# Altium footprint library Item_pcb.PcbLib: 282 footprints (part 2 of 18)
Each footprint in its own frame and in the unit in brackets; x right, y up, seen from the top. Pads: shape width x height; smd on the part's side, far side on the other; paste and mask are expansions set on the pad; w line width, h text height; cw(c..) or ccw(c..) is an arc to the next point about the centre after c.
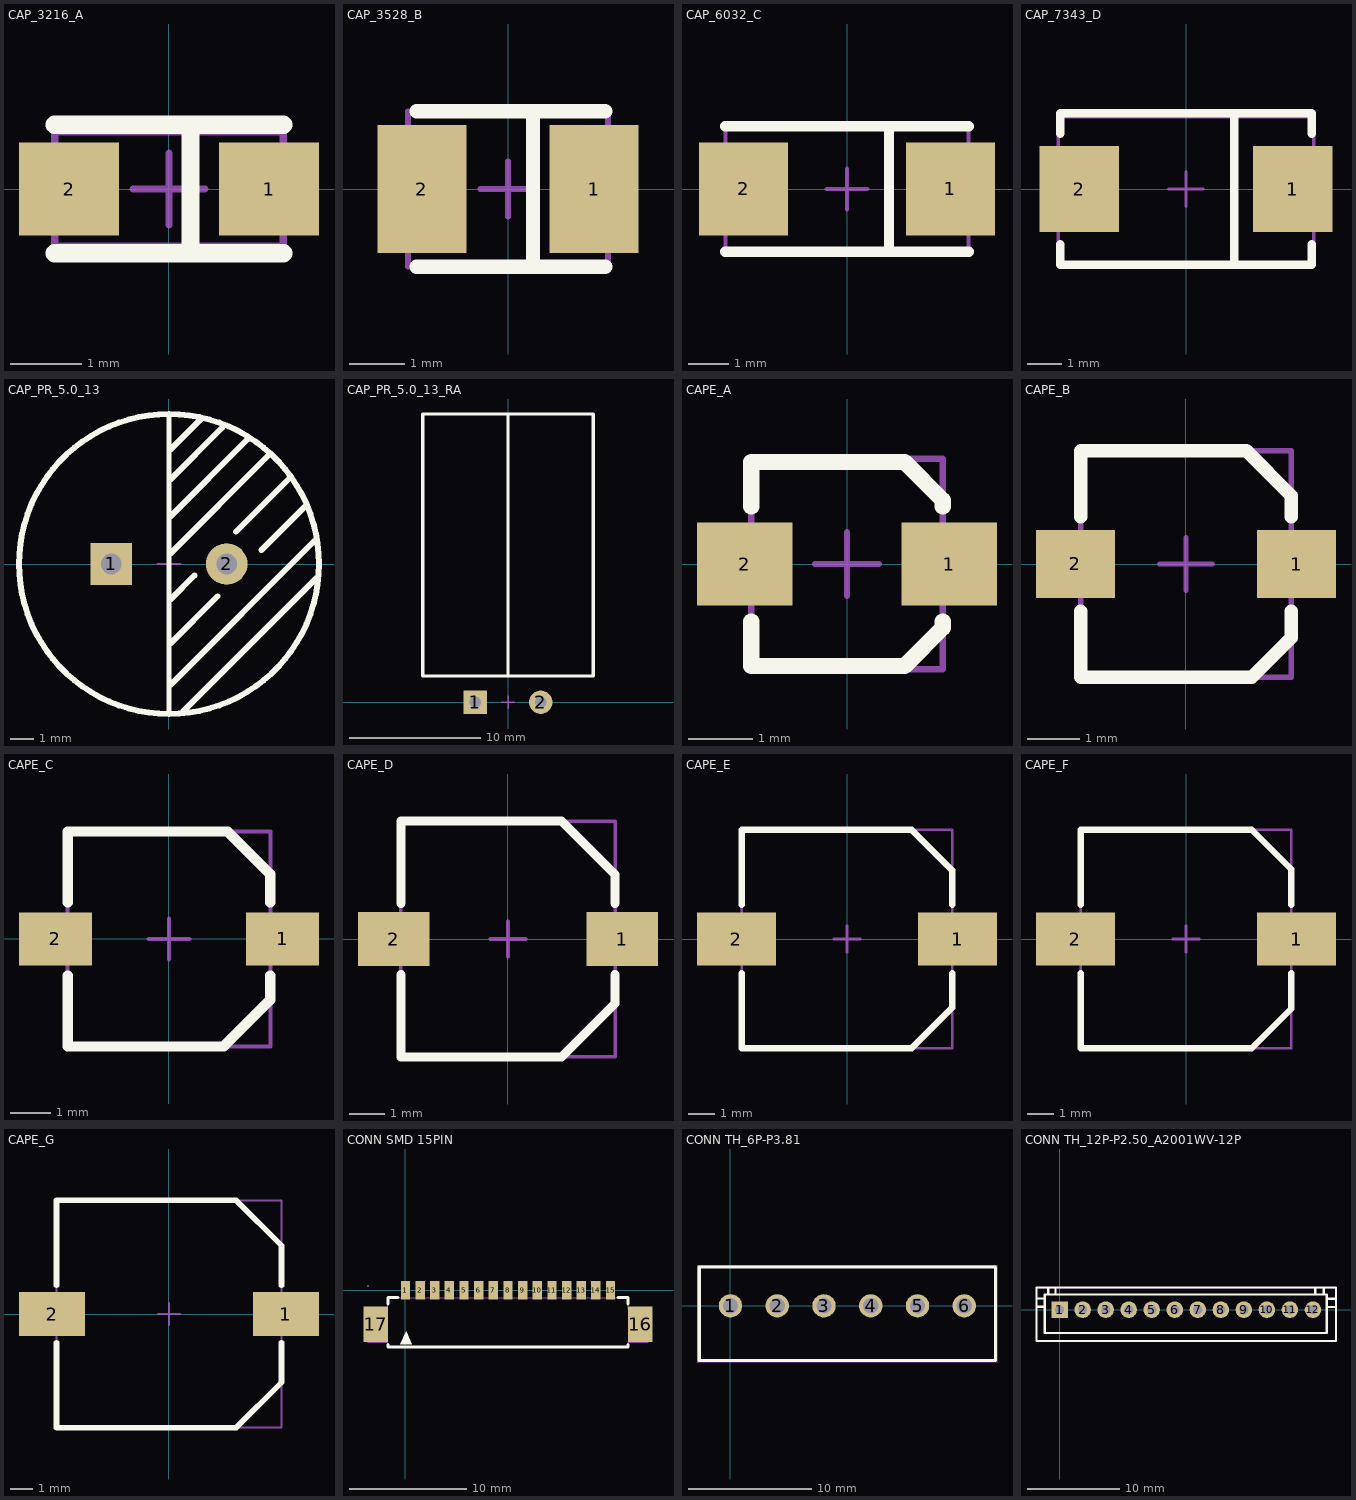
[diagram p1: the footprints below, top view; thin cyan lines are the x and y axes]

## CAP_3216_A [mm]
pads (2):
  rect 1.4x1.3 smd: 1(1.4,0) 2(-1.4,0)
Top Overlay:
  lines w0.254: -1.6,-0.9 1.6,-0.9 ; -1.6,0.9 1.6,0.9 ; 0.3,-0.9 0.3,0.9
Mechanical 15:
  lines w0.1: -0.5,0 0.5,0 ; 0,-0.5 0,0.5 ; -1.6,-0.8 -1.6,0.8 1.6,0.8 1.6,-0.8 -1.6,-0.8
3D body "CAP-A.STEP": height 1.6, standoff 0, extent -1.6,-0.8 1.6,0.8

## CAP_3528_B [mm]
pads (2):
  rect 1.6x2.3 smd: 1(1.55,0) 2(-1.55,0)
Top Overlay:
  lines w0.254: -1.65,-1.4 1.75,-1.4 ; -1.65,1.4 1.75,1.4 ; 0.45,-1.4 0.45,1.4
Mechanical 15:
  lines w0.1: -0.5,0 0.5,0 ; 0,-0.5 0,0.5 ; -1.8,-1.4 1.8,-1.4 1.8,1.4 -1.8,1.4 -1.8,-1.4
3D body "CAP-B.STEP": height 1.9, standoff 0, extent -1.75,-1.4 1.75,1.4

## CAP_6032_C [mm]
pads (2):
  rect 2.2x2.3 smd: 1(2.55,0) 2(-2.55,0)
Top Overlay:
  lines w0.254: -3,-1.55 3,-1.55 ; -3,1.55 3,1.55 ; 1.036,-1.55 1.036,1.55
Mechanical 15:
  lines w0.1: -0.5,0 0.5,0 ; 0,-0.5 0,0.5 ; -3,-1.6 -3,1.6 3,1.6 3,-1.6 -3,-1.6
3D body "CAP-C.STEP": height 2.5, standoff 0, extent -3,-1.6 3,1.6

## CAP_7343_D [mm]
pads (2):
  rect 2.3x2.5 smd: 1(3.1,0) 2(-3.1,0)
Top Overlay:
  lines w0.254: -3.65,-1.6 -3.65,-2.2 3.65,-2.2 3.65,-1.6 ; -3.65,1.6 -3.65,2.2 3.65,2.2 3.65,1.6 ; 1.4,-2.2 1.4,2.2
Mechanical 15:
  lines w0.1: -0.5,0 0.5,0 ; 0,-0.5 0,0.5 ; -3.7,-2.2 3.7,-2.2 3.7,2.1 -3.7,2.1 -3.7,-2.2
3D body "CAP-D.STEP": height 2.8, standoff 0, extent -3.65,-2.2 3.65,2.1

## CAP_PR_5.0_13 [mm] "13X21"
pads (2):
  rect 1.8x1.8 hole 0.9: 1(-2.5,0)
  round 1.8 hole 0.9: 2(2.5,0)
Top Overlay:
  circle w0.254: c0,0 r6.5
  lines w0.2: 0,-6.5 0,6.5
  lines w0.254: 0.05,-5.25 6.3,1 ; 0.05,-3.45 2.1,-1.4 ; 0.05,-1.55 1.1,-0.5 ; 0.05,0.45 4.3,4.7 ; 0.05,2.05 3.4,5.4 ; 0.05,3.65 2.3,5.9 ; 0.05,4.95 1.4,6.3 ; 0.6,-6.4 6.4,-0.6 ; 2.9,1.4 5.2,3.7 ; 4,0.6 5.9,2.5 ; 4.3,4.7 4.3,4.7 ; 6.4,-0.6 6.4,-0.6
Mechanical 15:
  circle w0.1: c0,0 r6.5
  lines w0.1: -0.5,0 0.5,0 ; 0,-0.5 0,0.5
3D body "CAP PR5.0x13x21mm.STEP": height 21.3, standoff -1.2, extent -6.5,-6.49 6.495,6.49

## CAP_PR_5.0_13_RA [mm] "13X20"
pads (2):
  rect 1.8x1.8 hole 0.9: 1(-2.5,0)
  round 1.8 hole 0.9: 2(2.5,0)
Top Overlay:
  lines w0.254: 0,2 0,22 ; -6.5,2 6.5,2 6.5,22 -6.5,22 -6.5,2
Mechanical 15:
  lines w0.1: -0.5,0 0.5,0 ; 0,-0.5 0,0.5 ; -6.5,2 -6.5,22 6.5,22 6.5,2 -6.5,2
3D body "CAP PR5.0X13X20mm RA.step": height 13.13, standoff -2.08, extent -6.525,-0.3 6.525,21.689

## CAPE_A [mm] "3X3.3X5.4"
pads (2):
  rect 1.5x1.3 smd: 1(1.6,0) 2(-1.6,0)
Top Overlay:
  lines w0.254: -1.5,-0.9 -1.5,-1.6 0.9,-1.6 1.5,-1 1.5,-0.9 ; -1.5,0.9 -1.5,1.6 0.9,1.6 1.5,1 1.5,0.9
Mechanical 15:
  lines w0.1: -0.5,0 0.5,0 ; 0,-0.5 0,0.5 ; -1.5,-1.65 1.5,-1.65 1.5,1.65 -1.5,1.65 -1.5,-1.65
3D body "CAPE-A.STEP": height 5.4, standoff 0, extent -1.8,-1.65 1.8,1.65

## CAPE_B [mm] "4X4.3X5.4"
pads (2):
  rect 1.5x1.3 smd: 1(2.1,0) 2(-2.1,0)
Top Overlay:
  lines w0.254: -2,-0.9 -2,-2.15 1.25,-2.15 2,-1.4 2,-0.9 ; -2,0.9 -2,2.15 1.15,2.15 2,1.3 2,0.9
Mechanical 15:
  lines w0.1: -0.5,0 0.5,0 ; 0,-0.5 0,0.5 ; 2,-2.15 -2,-2.15 -2,2.15 2,2.15 2,-2.115
3D body "CAPE-B.STEP": height 5.4, standoff 0, extent -2.3,-2.175 2.3,2.125

## CAPE_C [mm] "5X5.3X5.4"
pads (2):
  rect 1.8x1.3 smd: 1(2.8,0) 2(-2.8,0)
Top Overlay:
  lines w0.254: -2.5,-0.9 -2.5,-2.65 1.35,-2.65 2.5,-1.5 2.5,-0.9 ; -2.5,0.9 -2.5,2.65 1.45,2.65 2.5,1.6 2.5,0.9
Mechanical 15:
  lines w0.1: -0.5,0 0.5,0 ; 0,-0.5 0,0.5 ; -2.5,-2.65 -2.5,2.65 2.5,2.65 2.5,-2.65 -2.5,-2.65
3D body "CAPE-C.STEP": height 5.41, standoff 0, extent -2.95,-2.6 2.95,2.7

## CAPE_D [mm] "6.3X6.6X5.4"
pads (2):
  rect 2x1.5 smd: 1(3.2,0) 2(-3.2,0)
Top Overlay:
  lines w0.254: -3,-1 -3,-3.3 1.5,-3.3 3,-1.8 3,-1 ; -3,1 -3,3.3 1.5,3.3 3,1.8 3,1
Mechanical 15:
  lines w0.1: -0.5,0 0.5,0 ; 0,-0.5 0,0.5 ; -3,-3.3 -3,3.3 3,3.3 3,-3.3 -3,-3.3
3D body "CAPE-D.STEP": height 5.4, standoff 0, extent -3.5,-3.3 3.5,3.3

## CAPE_E [mm] "8X8.3X6.2"
pads (2):
  rect 3x2 smd: 1(4.2,0) 2(-4.2,0)
Top Overlay:
  lines w0.254: -4,-1.3 -4,-4.15 2.45,-4.15 4,-2.6 4,-1.3 ; -4,1.3 -4,4.15 2.45,4.15 4,2.6 4,1.3
Mechanical 15:
  lines w0.1: -0.5,0 0.5,0 ; 0,-0.5 0,0.5 ; -4,-4.15 -4,4.15 4,4.15 4,-4.15 -4,-4.15
3D body "CAPE-E.STEP": height 6.2, standoff 0, extent -4.5,-4.15 4.5,4.15

## CAPE_F [mm] "8X8.3X10.2"
pads (2):
  rect 3x2 smd: 1(4.2,0) 2(-4.2,0)
Top Overlay:
  lines w0.254: -4,-1.3 -4,-4.15 2.5,-4.15 4,-2.65 4,-1.3 ; -4,1.3 -4,4.15 2.5,4.15 4,2.65 4,1.3
Mechanical 15:
  lines w0.1: -0.5,0 0.5,0 ; 0,-0.5 0,0.5 ; -4,-4.15 -4,4.15 4,4.15 4,-4.15 -4,-4.15
3D body "CAPE-F.STEP": height 10.2, standoff 0, extent -4.95,-4.15 4.95,4.15

## CAPE_G [mm] "10X10.3X10.2"
pads (2):
  rect 3x2 smd: 1(5.3,0) 2(-5.3,0)
Top Overlay:
  lines w0.254: -5.1,-1.3 -5.1,-5.15 3.05,-5.15 5.1,-3.1 5.1,-1.3 ; -5.1,1.3 -5.1,5.15 3.05,5.15 5.1,3.1 5.1,1.3
Mechanical 15:
  lines w0.1: -0.5,0 0.5,0 ; 0,-0.5 0,0.5 ; -5.1,-5.15 5.1,-5.15 5.1,5.15 -5.1,5.15 -5.1,-5.15
3D body "CAPE-G.STEP": height 10.2, standoff 0, extent -5.8,-5.15 5.8,5.15

## CONN SMD 15PIN [mm] "1.25MM"
pads (17):
  rect 0.8x1.6 smd: 1(0,0) 2(1.25,0) 3(2.5,0) 4(3.75,0) 5(5,0) 6(6.25,0) 7(7.5,0) 8(8.75,0) 9(10,0) 10(11.25,0) 11(12.5,0) 12(13.75,0) 13(15,0) 14(16.25,0) 15(17.5,0)
  rect 2.1x3 smd: 16(20.05,-2.9) 17(-2.55,-2.9)
Top Overlay:
  region: -0.45,-4.6 0.55,-4.6 0.05,-3.5
  lines w0.254: -1.5,-4.631 -1.5,-4.85 19,-4.85 19,-4.631 ; -1.5,-1.169 -1.5,-0.625 -0.631,-0.625 ; 18.131,-0.625 19,-0.625 19,-1.169
Mechanical 15:
  region: -3.14,0.36 -3.141,0.384 -3.176,0.418 -3.224,0.418 -3.259,0.384 -3.26,0.36 -3.259,0.336 -3.224,0.302 -3.176,0.302 -3.141,0.336
  region: 17.34,0.36 17.66,0.36 17.66,-0.69 17.34,-0.69
  region: 16.09,0.36 16.41,0.36 16.41,-0.69 16.09,-0.69
  region: 14.84,0.36 15.16,0.36 15.16,-0.69 14.84,-0.69
  region: 13.59,0.36 13.91,0.36 13.91,-0.69 13.59,-0.69
  region: 12.34,0.36 12.66,0.36 12.66,-0.69 12.34,-0.69
  region: 11.09,0.36 11.41,0.36 11.41,-0.69 11.09,-0.69
  region: 9.84,0.36 10.16,0.36 10.16,-0.69 9.84,-0.69
  region: 8.59,0.36 8.91,0.36 8.91,-0.69 8.59,-0.69
  region: 7.34,0.36 7.66,0.36 7.66,-0.69 7.34,-0.69
  region: 6.09,0.36 6.41,0.36 6.41,-0.69 6.09,-0.69
  region: 4.84,0.36 5.16,0.36 5.16,-0.69 4.84,-0.69
  region: 3.59,0.36 3.91,0.36 3.91,-0.69 3.59,-0.69
  region: 2.34,0.36 2.66,0.36 2.66,-0.69 2.34,-0.69
  region: 1.09,0.36 1.41,0.36 1.41,-0.69 1.09,-0.69
  region: -0.16,0.36 0.16,0.36 0.16,-0.69 -0.16,-0.69
  region: 19.2,-1.64 20.7,-1.64 20.7,-3.84 19.2,-3.84
  region: -1.7,-3.84 -3.2,-3.84 -3.2,-1.64 -1.7,-1.64
  lines w0.051: -3.2,-4.45 -1.5,-4.45 -1.5,-4.85 19,-4.85 19,-4.45 20.7,-4.45 20.7,-1.64 19,-1.64 19,-0.64 -1.5,-0.64 -1.5,-1.64 -3.2,-1.64 -3.2,-4.45
3D body "3D_PCB2_2024-03-27-15P_end.STEP": height 3.6, standoff 0.2, extent -3.187,-4.826 20.713,0.364

## CONN TH_6P-P3.81 [mm] "P3.81mm"
pads (6):
  round 1.9 hole 1.25: 1(0,0) 2(3.81,0) 3(7.62,0) 4(11.43,0) 5(15.24,0) 6(19.05,0)
Top Overlay:
  lines w0.254: -2.54,-4.445 -2.54,-1.905 -2.54,3.175 21.59,3.175 21.59,-4.445 -2.54,-4.445
Mechanical 15:
  region: -2.727,-4.572 -2.726,-4.596 -2.691,-4.63 -2.643,-4.63 -2.608,-4.596 -2.607,-4.572 -2.608,-4.548 -2.643,-4.514 -2.691,-4.514 -2.726,-4.548
  region: 18.525,0 18.525,-0.104 18.605,-0.297 18.753,-0.445 18.946,-0.525 19.154,-0.525 19.347,-0.445 19.495,-0.297 19.575,-0.104 19.575,0 19.575,0.104 19.495,0.297 19.347,0.445 19.154,0.525 18.946,0.525 18.753,0.445 18.605,0.297 18.525,0.104
  region: 14.715,0 14.715,-0.104 14.795,-0.297 14.943,-0.445 15.136,-0.525 15.344,-0.525 15.537,-0.445 15.685,-0.297 15.765,-0.104 15.765,0 15.765,0.104 15.685,0.297 15.537,0.445 15.344,0.525 15.136,0.525 14.943,0.445 14.795,0.297 14.715,0.104
  region: 10.905,0 10.905,-0.104 10.985,-0.297 11.133,-0.445 11.326,-0.525 11.534,-0.525 11.727,-0.445 11.875,-0.297 11.955,-0.104 11.955,0 11.955,0.104 11.875,0.297 11.727,0.445 11.534,0.525 11.326,0.525 11.133,0.445 10.985,0.297 10.905,0.104
  region: 7.095,0 7.095,-0.104 7.175,-0.297 7.323,-0.445 7.516,-0.525 7.724,-0.525 7.917,-0.445 8.065,-0.297 8.145,-0.104 8.145,0 8.145,0.104 8.065,0.297 7.917,0.445 7.724,0.525 7.516,0.525 7.323,0.445 7.175,0.297 7.095,0.104
  region: 3.285,0 3.285,-0.104 3.365,-0.297 3.513,-0.445 3.706,-0.525 3.914,-0.525 4.107,-0.445 4.255,-0.297 4.335,-0.104 4.335,0 4.335,0.104 4.255,0.297 4.107,0.445 3.914,0.525 3.706,0.525 3.513,0.445 3.365,0.297 3.285,0.104
  region: -0.525,0 -0.525,-0.104 -0.445,-0.297 -0.297,-0.445 -0.104,-0.525 0.104,-0.525 0.297,-0.445 0.445,-0.297 0.525,-0.104 0.525,0 0.525,0.104 0.445,0.297 0.297,0.445 0.104,0.525 -0.104,0.525 -0.297,0.445 -0.445,0.297 -0.525,0.104
  lines w0.051: -2.667,-4.572 -2.667,3.302 21.717,3.302 21.717,-4.572 -2.667,-4.572
3D body "wenjian2.step": height 9.15, standoff -3.5, extent -2.345,-4.135 21.395,2.866

## CONN TH_12P-P2.50_A2001WV-12P [mm]
pads (12):
  rect 1.8x1.8 hole 1 paste+0 mask+0.05: 1(0,0)
  round 1.8 hole 1 copper offset 0,0 paste+0 mask+0.05: 2(2.5,-0.001) 3(5.001,-0.001) 4(7.5,-0.001) 5(10,-0.001) 6(12.5,-0.002) 7(15,-0.002) 8(17.5,-0.001) 9(20,-0.002) 10(22.5,-0.002) 11(25,-0.003) 12(27.5,-0.003)
Top Overlay:
  lines w0.254: -2.5,0.324 -1.618,0.324 ; -2.5,1.22 -1.618,1.218 ; -1.231,1.649 -1.231,2.399 ; -0.451,1.649 -0.451,2.399 ; 27.741,1.649 27.741,2.399 ; 28.673,1.649 28.673,2.399 ; 28.989,0.281 30,0.281 ; 28.989,1.17 30,1.17 ; -2.5,-3.401 -2.5,2.399 30,2.399 30,-3.401 -2.5,-3.401 ; -1.618,-2.542 -1.618,1.649 28.989,1.649 28.989,-2.542 15.146,-2.542 13.114,-2.542 -1.618,-2.542
Mechanical 15:
  region: 27.2,0.297 27.8,0.297 27.8,-0.303 27.2,-0.303
  region: 14.7,0.299 15.3,0.299 15.3,-0.301 14.7,-0.301
  region: 17.2,0.3 17.8,0.3 17.8,-0.3 17.2,-0.3
  region: 19.7,0.298 20.3,0.298 20.3,-0.302 19.7,-0.302
  region: 22.2,0.298 22.8,0.298 22.8,-0.302 22.2,-0.302
  region: 24.7,0.298 25.3,0.298 25.3,-0.302 24.7,-0.302
  region: 12.2,0.299 12.8,0.299 12.8,-0.301 12.2,-0.301
  region: 9.7,0.299 10.3,0.299 10.3,-0.301 9.7,-0.301
  region: 7.2,0.299 7.8,0.299 7.8,-0.301 7.2,-0.301
  region: 4.7,0.299 5.3,0.299 5.3,-0.301 4.7,-0.301
  region: 2.2,0.3 2.8,0.3 2.8,-0.3 2.2,-0.3
  region: -0.3,0.3 0.3,0.3 0.3,-0.3 -0.3,-0.3
  region: -2.44,2.399 -2.441,2.423 -2.476,2.457 -2.524,2.457 -2.559,2.423 -2.56,2.399 -2.559,2.375 -2.524,2.341 -2.476,2.342 -2.441,2.375
  lines w0.051: -2.5,-3.401 30,-3.401 30,2.399 -2.5,2.399 -2.5,-3.401
3D body "3D_PCB2_2024-03-27-12PIN_end.STEP": height 7.5, standoff -2.6, extent -2.54,-3.302 29.96,2.499